# Altium schematic symbol library IC_ADI.SCHLIB: 3169 symbols (part 40 of 181) (continued)
## AD7147WPACPZ-1500R (continued)
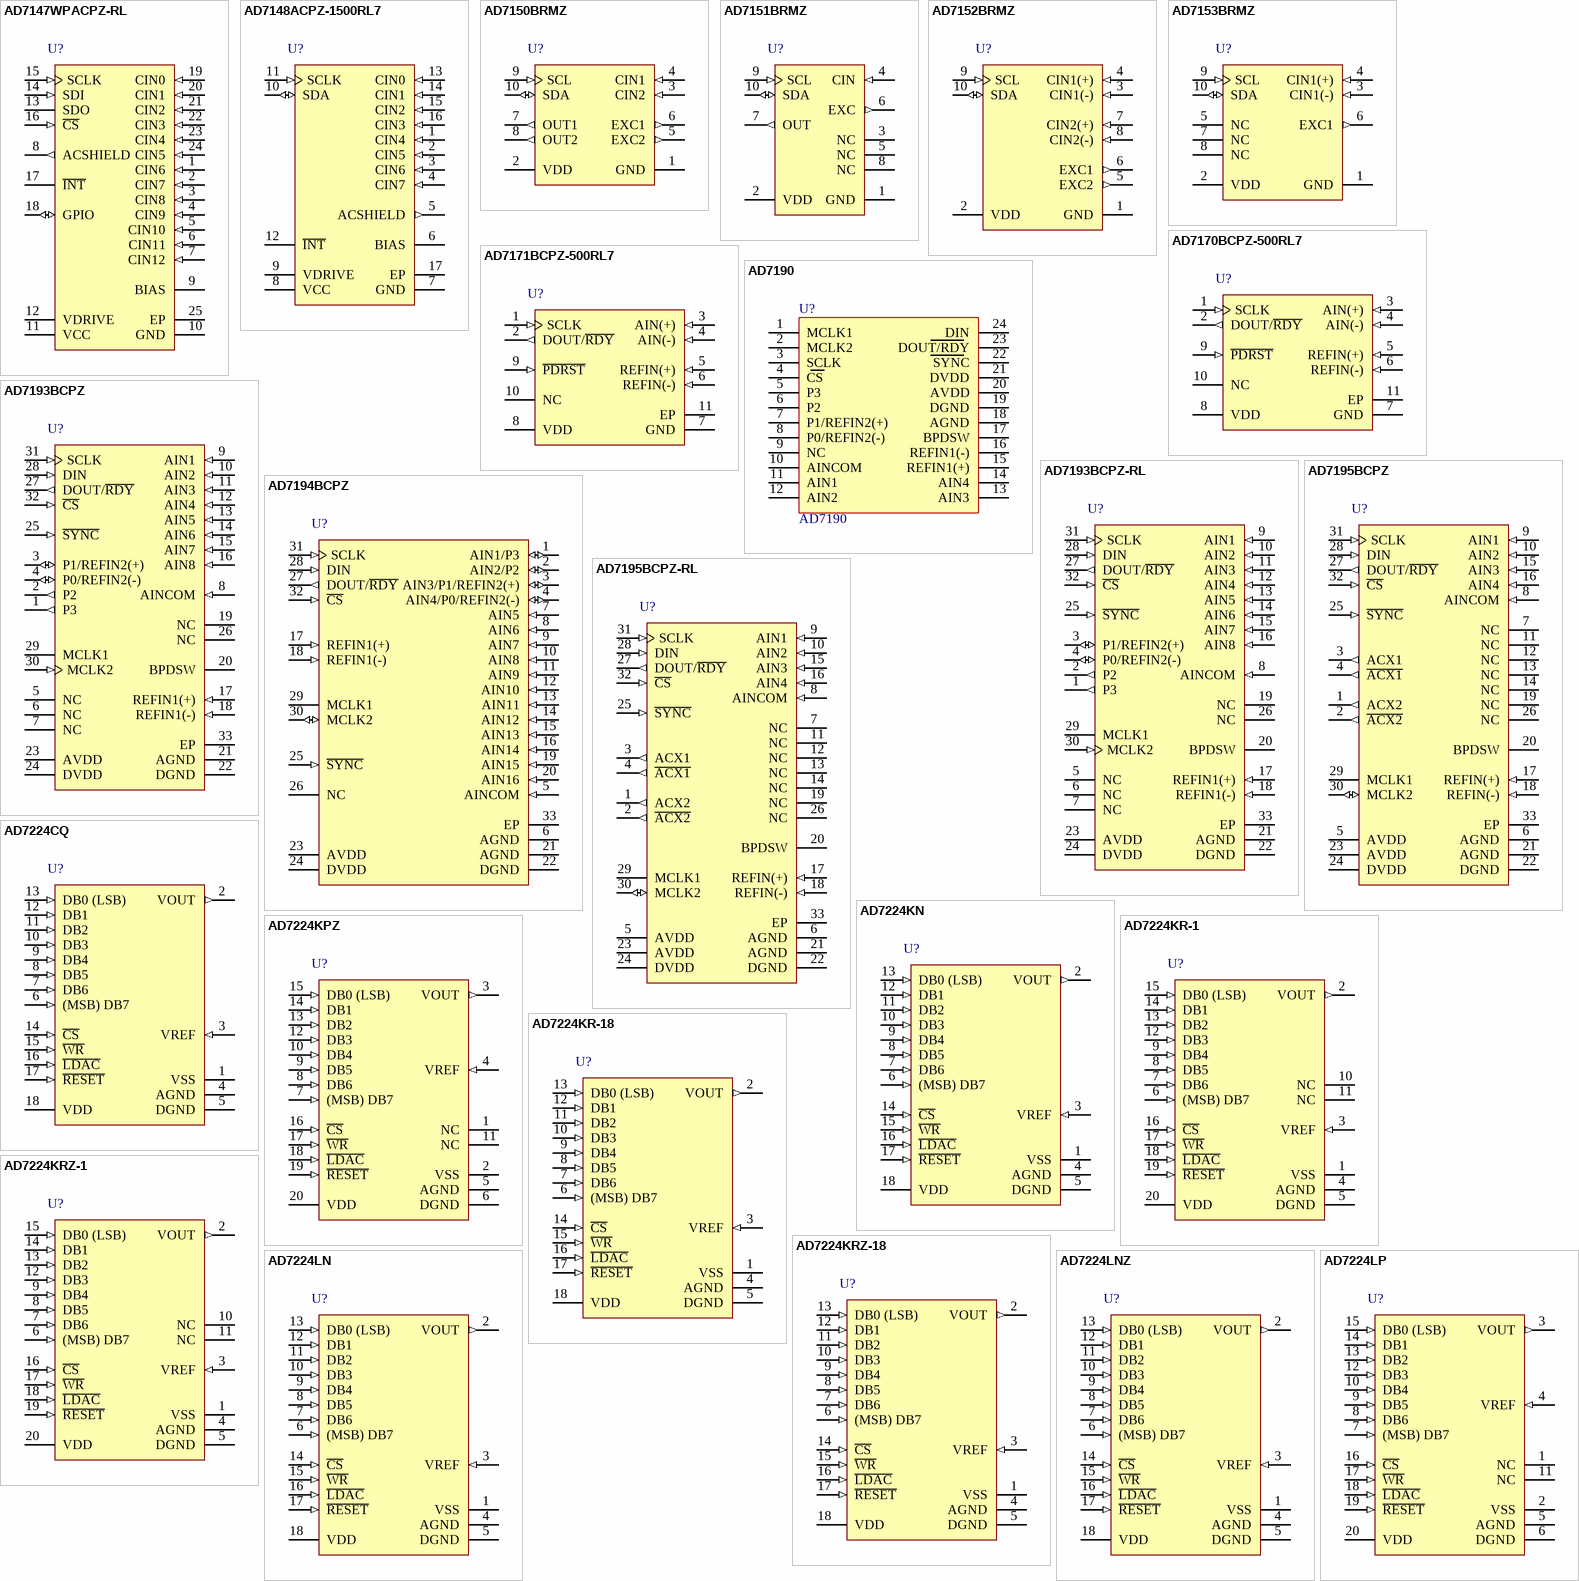
[diagram p36: symbols AD7147WPACPZ-RL to AD7224LP]

## AD7147WPACPZ-RL
designator U?
13 Channel CapTouch Programmable Controller for Single-Electrode Capacitance Sensors, 111SPS, -40 to +85 degC, CP-24-3, Pb-Free, Reel; Generic Part Number: AD7147; PartNumber: AD7147WPACPZ-RL; Resolution (Bits): 16; Channels: 13; Throughput Rate (SPS): 111; Interface: I2C/Ser 2-Wire, Ser, SPI; Automotive Qualified: Yes; DatasheetVersion: Rev.D; PackageVersion: Jan-2005; PackageReference: CP-24-3; PackageDescription: 24-Lead Lead Frame Chip Scale Package [LFCSP_VQ] 4 x 4 mm Body, Very Thin Quad; Supplier Part Number 1: AD7147WPACPZ-RL-ND; Supplier Part Number 2: 584-AD7147WPACPZ-R; RoHS: Y; Packing: Reel; Mounting Technology: Surface Mount; Code_JEDEC: MO-220-VGGD-8; ComponentLink1Description: Manufacturer URL; ComponentLink2Description: Datasheet; ComponentLink3Description: Package Specification; ComponentLink4Description: Product URL
footprint QFN24_0.5-PAD(4X4) (Footprint not found)
pins: 1 CIN6 (in) "Capacitance Sensor Input.", 2 CIN7 (in) "Capacitance Sensor Input.", 3 CIN8 (in) "Capacitance Sensor Input.", 4 CIN9 (in) "Capacitance Sensor Input.", 5 CIN10 (in) "Capacitance Sensor Input.", 6 CIN11 (in) "Capacitance Sensor Input.", 7 CIN12 (in) "Capacitance Sensor Input.", 8 ACSHIELD (out) "CDC Active Shield Output. Connect to external shield or plane.", 9 BIAS "Bias Node for Internal Circuitry. Requires 100 nF capacitor to ground.", 10 GND (power) "Ground Reference Point for All Circuitry.", 11 VCC (power) "Supply Voltage.", 12 VDRIVE (power) "Serial Interface Operating Voltage Supply.", 13 SDO (hiz) "SPI Serial Data Output.", 14 SDI (in) "SPI Serial Data Input.", 15 SCLK (in) "Clock Input for Serial Interface.", 16 ~{CS} (in) "SPI Chip Select Signal.", 17 ~{INT} (oc) "General-Purpose Open-Drain Interrupt Output. Programmable polarity; requires pull-up resistor.", 18 GPIO (io) "Programmable GPIO.", 19 CIN0 (in) "Capacitance Sensor Input.", 20 CIN1 (in) "Capacitance Sensor Input.", 21 CIN2 (in) "Capacitance Sensor Input.", 22 CIN3 (in) "Capacitance Sensor Input.", 23 CIN4 (in) "Capacitance Sensor Input.", 24 CIN5 (in) "Capacitance Sensor Input.", 25 EP (power) "Capacitance Sensor Input."

## AD7148ACPZ-1500RL7
designator U?
Octal 16-Bit Analog-to-Digital Converter with I2C/Ser 2-Wire, Serial Interface, 250kSPS, -40 to +85 degC, CP-16-13, Pb-Free, Reel; Generic Part Number: AD7148; PartNumber: AD7148ACPZ-1500RL7; Resolution (Bits): 16; Channels: 8; Throughput Rate (SPS): 4; DatasheetVersion: Rev.A; PackageVersion: 031006-A; PackageReference: CP-16-13; PackageDescription: 16-Lead Lead Frame Chip Scale Package [LFCSP_VQ] 4 x 4 mm Body, Very Thin Quad; Supplier Part Number 1: AD7148ACPZ-1500RL7TR-ND; Supplier Part Number 2: AD7148ACPZ-1500RL7CT-ND; Supplier Part Number 3: AD7148ACPZ-1500RL7DKR-ND; Supplier Part Number 4: 84M7803; Supplier Part Number 5: 584-AD7148ACPZ1500R7; Interface: I2C/Ser 2-Wire, Ser; RoHS: Y; Packing: Reel; Mounting Technology: Surface Mount; Code_JEDEC: MO-220-VGGC; ComponentLink1Description: Manufacturer URL; ComponentLink2Description: Datasheet; ComponentLink3Description: Package Specification; ComponentLink4Description: Product URL
footprint QFN16_0.65-PAD(4x4) (Footprint not found)
pins: 1 CIN4 (in) "Capacitance Sensor Input.", 2 CIN5 (in) "Capacitance Sensor Input.", 3 CIN6 (in) "Capacitance Sensor Input.", 4 CIN7 (in) "Capacitance Sensor Input.", 5 ACSHIELD (out) "CDC Active Shield Output. Connect to external shield.", 6 BIAS "Bias Node for Internal Circuitry. Requires 100 nF capacitor to ground.", 7 GND (power) "Ground Reference Point for All Circuitry.", 8 VCC (power) "Supply Voltage.", 9 VDRIVE (power) "Serial Interface Operating Voltage Supply.", 10 SDA (io) "I2C Serial Data Input/Output. SDA requires pull-up resistor.", 11 SCLK (in) "Clock Input for Serial Interface.", 12 ~{INT} (oc) "General-Purpose Open-Drain Interrupt Output. Programmable polarity; requires pull-up resistor.", 13 CIN0 (in) "Capacitance Sensor Input.", 14 CIN1 (in) "Capacitance Sensor Input.", 15 CIN2 (in) "Capacitance Sensor Input.", 16 CIN3 (in) "Capacitance Sensor Input.", 17 EP (power) "The exposed pad is not connected internally. For increased reliability of the solder joint and maximum thermal capability, it is recommended that the pad be soldered to the ground plane."

## AD7150BRMZ
designator U?
Dual 12-Bit Low Power Analog-to-Digital Converter with I2C/Ser 2-Wire, Serial Interface, 200SPS, -40 to +85 degC, RM-10, Pb-Free, Tube; Generic Part Number: AD7150; PartNumber: AD7150BRMZ; Resolution (Bits): 12; Channels: 2; Throughput Rate (SPS): 200; DatasheetVersion: Rev.0; PackageVersion: May-2005; PackageReference: RM-10; PackageDescription: 10-Lead Mini Small Outline Package [MSOP]; Supplier Part Number 1: AD7150BRMZ-ND; Supplier Part Number 2: 1563482; Supplier Part Number 3: 64M7550; Supplier Part Number 4: 584-AD7150BRMZ; Interface: I2C/Ser 2-Wire, Ser; RoHS: Y; Packing: Tube; Mounting Technology: Surface Mount; ComponentLink1Description: Manufacturer URL; ComponentLink2Description: Datasheet; ComponentLink3Description: Package Specification; ComponentLink4Description: Product URL
footprint VSSOP10_0.5 (Footprint not found)
pins: 1 GND (power) "Ground Pin.", 2 VDD (power) "Power Supply Voltage. This pin should be decoupled to GND using a low impedance capacitor, for example, 0.1uF X7R multilayer ceramic.", 3 CIN2 (in) "CDC Capacitive Input Channel 2. The measured capacitance (sensor) is connected between the EXC2 pin and the CIN2 pin. If not used, this pin can be left open circuit or connected to GND.", 4 CIN1 (in) "CDC Capacitive Input Channel 1. The measured capacitance (sensor) is connected between the EXC1 pin and the CIN1 pin. If not used, this pin can be left open circuit or connected to GND.", 5 EXC2 (out) "CDC Excitation Output Channel 2. The measured capacitance is connected between the EXC2 pin and the CIN2 pin. If not used, this pin should be left as an open circuit.", 6 EXC1 (out) "CDC Excitation Output Channel 1. The measured capacitance is connected between the EXC1 pin and the CIN1 pin. If not used, this pin should be left as an open circuit.", 7 OUT1 (out) "Logic Output Channel 1. A high level on this output indicates proximity detected on CIN1.", 8 OUT2 (out) "Logic Output Channel 2. A high level on this output indicates proximity detected on CIN2.", 9 SCL (in) "Serial Interface Clock Input. Connects to the master clock line. Requires a pull-up resistor if not provided elsewhere in the system.", 10 SDA (io) "Serial Interface Bidirectional Data. Connects to the master data line. Requires a pull-up resistor if not provided elsewhere in the system."

## AD7151BRMZ
designator U?
Single 12-Bit Low Power Analog-to-Digital Converter with I2C/Ser 2-Wire, Serial Interface, 100SPS, -40 to +85 degC, RM-10, Pb-Free, Tube; Generic Part Number: AD7151; PartNumber: AD7151BRMZ; Resolution (Bits): 12; Channels: 1; Throughput Rate (SPS): 100; DatasheetVersion: Rev.0; PackageVersion: May-2005; PackageReference: RM-10; PackageDescription: 10-Lead Mini Small Outline Package [MSOP]; Supplier Part Number 1: AD7151BRMZ-ND; Supplier Part Number 2: 64M7552; Supplier Part Number 3: 584-AD7151BRMZ; Interface: I2C/Ser 2-Wire, Ser; RoHS: Y; Packing: Tube; Mounting Technology: Surface Mount; ComponentLink1Description: Manufacturer URL; ComponentLink2Description: Datasheet; ComponentLink3Description: Package Specification; ComponentLink4Description: Product URL
footprint VSSOP10_0.5 (Footprint not found)
pins: 1 GND (power) "Ground Pin.", 2 VDD (power) "Power Supply Voltage. This pin should be decoupled to GND using a low impedance capacitor, for example, 0.1 uF X7R multilayer ceramic.", 3 NC "This pin should be left as an open circuit or connected to GND.", 4 CIN (in) "CDC Capacitive Input. The measured capacitance (sensor) is connected between the EXC pin and the CIN pin.", 5 NC "This pin should be left as an open circuit.", 6 EXC (out) "CDC Excitation Output. The measured capacitance is connected between the EXC pin and the CIN pin.", 7 OUT (out) "Logic Output. High level on this output indicates proximity detected on the capacitive input.", 8 NC "This pin should be left as an open circuit.", 9 SCL (in) "Serial Interface Clock Input. Connects to the master clock line. Requires a pull-up resistor if not provided elsewhere in the system.", 10 SDA (io) "Serial Interface Bidirectional Data. Connects to the master data line. Requires a pull-up resistor if not provided elsewhere in the system."

## AD7152BRMZ
designator U?
Dual 12-Bit Capacitance-to-Digital Converter with I2C/Ser 2-Wire, Serial Interface, 200SPS, -40 to +85 degC, RM-10, Pb-Free, Tube; Generic Part Number: AD7152; PartNumber: AD7152BRMZ; Resolution (Bits): 12; Channels: 2; Throughput Rate (SPS): 200; DatasheetVersion: Rev.0; PackageVersion: May-2005; PackageReference: RM-10; PackageDescription: 10-Lead Mini Small Outline Package [MSOP]; Supplier Part Number 1: AD7152BRMZ-ND; Supplier Part Number 2: 584-AD7152BRMZ; Interface: I2C/Ser 2-Wire, Ser; RoHS: Y; Packing: Tube; Mounting Technology: Surface Mount; ComponentLink1Description: Manufacturer URL; ComponentLink2Description: Datasheet; ComponentLink3Description: Package Specification; ComponentLink4Description: Product URL
footprint VSSOP10_0.5 (Footprint not found)
pins: 1 GND (power) "Ground Pin.", 2 VDD (power) "Power Supply Voltage. This pin should be decoupled to GND, using a low impedance capacitor, for example, in combination with a 10 uF tantalum and a 0.1 uF multilayer ceramic capacitor.", 3 CIN1(-) (in) "CDC Negative Capacitive Input of Channel 1. If not used, this pin can be left as an open circuit or connected to GND. This pin is internally disconnected in single-ended CDC configuration.", 4 CIN1(+) (in) "CDC Positive Capacitive Input of Channel 1. If not used, this pin can be left as an open circuit or connected to GND.", 5 EXC2 (out) "CDC Excitation Output for Channel 2. The measured capacitance is connected between one of the EXC pins and one of the CIN pins. If not used, these pins should be left as an open circuit.", 6 EXC1 (out) "CDC Excitation Output for Channel 1. The measured capacitance is connected between one of the EXC pins and one of the CIN pins. If not used, these pins should be left as an open circuit.", 7 CIN2(+) (in) "CDC Positive Capacitive Input of Channel 2. If not used, this pin can be left as an open circuit or connected to GND.", 8 CIN2(-) (in) "CDC Negative Capacitive Input of Channel 2. If not used, this pin can be left as an open circuit or connected to GND. This pin is internally disconnected in single-ended CDC configuration.", 9 SCL (in) "Serial Interface Clock Input. Connects to the master clock line. Requires a pull-up resistor if one is not already provided in the system.", 10 SDA (io) "Serial Interface Bidirectional Data. Connects to the master data line. Requires a pull-up resistor if one is not provided elsewhere in the system."

## AD7153BRMZ
designator U?
Single 12-Bit Capacitance-to-Digital Converter with I2C/Ser 2-Wire, Serial Interface, 200SPS, -40 to +85 degC, RM-10, Pb-Free, Tube; Generic Part Number: AD7153; PartNumber: AD7153BRMZ; Resolution (Bits): 12; Channels: 1; Throughput Rate (SPS): 200; DatasheetVersion: Rev.0; PackageVersion: May-2005; PackageReference: RM-10; PackageDescription: 10-Lead Mini Small Outline Package [MSOP]; Supplier Part Number 1: AD7153BRMZ-ND; Supplier Part Number 2: 11N8856; Supplier Part Number 3: 584-AD7153BRMZ; Interface: I2C/Ser 2-Wire, Ser; RoHS: Y; Packing: Tube; Mounting Technology: Surface Mount; ComponentLink1Description: Manufacturer URL; ComponentLink2Description: Datasheet; ComponentLink3Description: Package Specification; ComponentLink4Description: Product URL
footprint VSSOP10_0.5 (Footprint not found)
pins: 1 GND (power) "Ground Pin.", 2 VDD (power) "Power Supply Voltage. This pin should be decoupled to GND, using a low impedance capacitor, for example, in combination with a 10 uF tantalum and a 0.1 uF multilayer ceramic capacitor.", 3 CIN1(-) (in) "CDC Negative Capacitive Input of Channel 1. If not used, this pin can be left as an open circuit or connected to GND. This pin is internally disconnected in single-ended CDC configuration.", 4 CIN1(+) (in) "CDC Positive Capacitive Input of Channel 1. If not used, this pin can be left as an open circuit or connected to GND.", 5 NC "No Connect. This pin must be left as an open circuit.", 6 EXC1 (out) "CDC Excitation Output for Channel 1. The measured capacitance is connected between one of the EXC pins and one of the CIN pins. If not used, these pins should be left as an open circuit.", 7 NC "No Connect. This pin must be left as an open circuit.", 8 NC "No Connect. This pin must be left as an open circuit.", 9 SCL (in) "Serial Interface Clock Input. Connects to the master clock line. Requires a pull-up resistor if one is not already provided in the system.", 10 SDA (io) "Serial Interface Bidirectional Data. Connects to the master data line. Requires a pull-up resistor if one is not provided elsewhere in the system."

## AD7170BCPZ-500RL7
designator U?
Single 12-Bit Low Power Sigma-Delta Analog-to-Digital Converter with Serial, SPI Interface, 125SPS, -40 to +105 degC, CP-10-3, Pb-Free, Reel; Generic Part Number: AD7170; PartNumber: AD7170BCPZ-500RL7; Resolution (Bits): 12; Channels: 1; Throughput Rate (SPS): 125; Interface: Ser, SPI; DatasheetVersion: Rev.A; PackageVersion: 2005; PackageReference: CP-10-3; PackageDescription: 10-Lead Lead Frame Chip Scale Package [LFCSP_WD] 3 x 3 mm Body, Very Very Thin, Dual Lead; Supplier Part Number 1: 1827292; Supplier Part Number 2: 81R1736; Supplier Part Number 3: 584-AD7170BCPZ-500R7; RoHS: Y; Packing: Reel; Mounting Technology: Surface Mount; ComponentLink1Description: Manufacturer URL; ComponentLink2Description: Datasheet; ComponentLink3Description: Package Specification; ComponentLink4Description: Product URL
footprint DFN10_0.5-PAD(3X3) (Footprint not found)
pins: 1 SCLK (in) "Serial Clock Input. This serial clock input is for data transfers from the ADC. The SCLK has a Schmitt-triggered input. The serial clock can be continuous with all data transmitted in a constant train of pulses. (See Datasheet)", 2 DOUT/~{RDY} (out) "Serial Data Output/Data Ready Output. DOUT/R\D\Y\ serves a dual purpose. DOUT/R\D\Y\ operates as a data ready pin, going low to indicate the completion of a conversion. In addition, it functions as a serial data output pin (See Datasheet)", 3 AIN(+) (in) "Analog Input. AIN(+) is the positive terminal of the differential analog input pair AIN(+)/AIN(-).", 4 AIN(-) (in) "Analog Input. AIN(-) is the negative terminal of the differential analog input pair AIN(+)/AIN(-).", 5 REFIN(+) (in) "Positive Reference Input. An external reference can be applied between REFIN(+) and REFIN(-). The nominal reference voltage (REFIN(+) - REFIN(?)) is 5 V, but the part can function with a reference of 0.5 V to VDD.", 6 REFIN(-) (in) "Negative Reference Input.", 7 GND (power) "Ground Reference Point.", 8 VDD (power) "Supply Voltage, 2.7 V to 5.25 V.", 9 ~{PDRST} (in) "Power-Down/Reset. When this pin is low, the ADC is placed in power-down mode. All the logic on the chip is reset, and the DOUT/R\D\Y\ pin is tristated. When P\D\R\S\T\ is high, the ADC is taken out of power-down mode. The (See Datasheet)", 10 NC "This pin should be connected to GND for correct operation.", 11 EP (power) "Connect the exposed pad to ground."

## AD7171BCPZ-500RL7
designator U?
Single 16-Bit Low Power Sigma-Delta Analog-to-Digital Converter with Serial, SPI Interface, 125SPS, -40 to +105 degC, CP-10-3, Pb-Free, Reel; Generic Part Number: AD7171; PartNumber: AD7171BCPZ-500RL7; Resolution (Bits): 16; Channels: 1; Throughput Rate (SPS): 125; Interface: Ser, SPI; DatasheetVersion: Rev.0; PackageVersion: 2005; PackageReference: CP-10-3; PackageDescription: 10-Lead Lead Frame Chip Scale Package [LFCSP_WD] 3 x 3 mm Body, Very Very Thin, Dual Lead; Supplier Part Number 1: AD7171BCPZ-500RL7TR-ND; Supplier Part Number 2: AD7171BCPZ-500RL7CT-ND; Supplier Part Number 3: AD7171BCPZ-500RL7DKR-ND; Supplier Part Number 4: 1827293; Supplier Part Number 5: 52R8151; Supplier Part Number 6: 24W8482; Supplier Part Number 7: 584-AD7171BCPZ-500R7; RoHS: Y; Packing: Reel; Mounting Technology: Surface Mount; ComponentLink1Description: Manufacturer URL; ComponentLink2Description: Datasheet; ComponentLink3Description: Package Specification; ComponentLink4Description: Product URL
footprint DFN10_0.5-PAD(3X3) (Footprint not found)
pins: 1 SCLK (in) "Serial Clock Input. This serial clock input is for data transfers from the ADC. The SCLK has a Schmitt-triggered input. The serial clock can be continuous with all data transmitted in a constant train of pulses. (See Datasheet)", 2 DOUT/~{RDY} (out) "Serial Data Output/Data Ready Output. DOUT/R\D\Y\ serves a dual purpose. DOUT/R\D\Y\ operates as a data ready pin, going low to indicate the completion of a conversion. In addition, it functions as a serial data output pin (See Datasheet)", 3 AIN(+) (in) "Analog Input. AIN(+) is the positive terminal of the differential analog input pair AIN(+)/AIN(-).", 4 AIN(-) (in) "Analog Input. AIN(-) is the negative terminal of the differential analog input pair AIN(+)/(AIN-).", 5 REFIN(+) (in) "Positive Reference Input. An external reference can be applied between REFIN(+) and REFIN(-). The nominal reference voltage (REFIN(+)- REFIN(-)) is 5 V, but the part can function with a reference of 0.5 V to VDD.", 6 REFIN(-) (in) "Negative Reference Input.", 7 GND (power) "Ground Reference Point.", 8 VDD (power) "Supply Voltage, 2.7 V to 5.25 V.", 9 ~{PDRST} (in) "Power-Down/Reset. When this pin is low, the ADC is placed in power-down mode. All the logic on the chip is reset and the DOUT/R\D\Y\ pin is tristated. When P\D\R\S\T\ is high, the ADC is taken out of power-down mode. The (See Datasheet)", 10 NC "This pin should be connected to GND for correct operation.", 11 EP (power) "Connect the exposed pad to ground."

## AD7190
designator U?
footprint TSSOP24_0.65 (TSOP, 24-Leads, Body 7.80x4.40mm, Pitch 0.65mm, Thermal Pad 5.16x2.40mm, IPC Low Density)
pins: 1 MCLK1, 2 MCLK2, 3 SCLK, 4 CS, 5 P3, 6 P2, 7 P1/REFIN2(+), 8 P0/REFIN2(-), 9 NC, 10 AINCOM, 11 AIN1, 12 AIN2, 13 AIN3, 14 AIN4, 15 REFIN1(+), 16 REFIN1(-), 17 BPDSW, 18 AGND, 19 DGND, 20 AVDD, 21 DVDD, 22 SYNC, 23 DOUT/RDY, 24 DIN

## AD7193BCPZ
designator U?
Quad 24-Bit Ultralow Noise Sigma-Delta Analog-to-Digital Converter with Serial, SPI Interface and PGA, 4.8KSPS, -40 to +105 degC, CP-32-11, Pb-Free, Tray; Generic Part Number: AD7193; PartNumber: AD7193BCPZ; Resolution (Bits): 24; Channels: 4; Throughput Rate (SPS): 4.8K; Interface: Ser, SPI; DatasheetVersion: Rev.C; PackageVersion: 011708-A; PackageReference: CP-32-11; PackageDescription: 32-Lead Lead Frame Chip Scale Package [LFCSP_VQ] 5 x 5 mm Body, Very Thin Quad; Supplier Part Number 1: AD7193BCPZ-ND; Supplier Part Number 2: 74R5970; Supplier Part Number 3: 584-AD7193BCPZ; RoHS: Y; Packing: Tray; Mounting Technology: Surface Mount; ComponentLink1Description: Manufacturer URL; ComponentLink2Description: Datasheet; ComponentLink3Description: Package Specification; ComponentLink4Description: Product URL
footprint QFN32_0.5-PAD(5X5) (Footprint not found)
pins: 1 P3 (out) "Digital Output Pin. This pin can function as a general-purpose output bit referenced between AVDD and AGND.", 2 P2 (out) "Digital Output Pin. This pin can function as a general-purpose output bit referenced between AVDD and AGND.", 3 P1/REFIN2(+) (io) "Digital Output Pin/Positive Reference Input. This pin functions as a general-purpose output bit referenced between AVDD and AGND. When the REFSEL bit in the configuration register = 1, this pin functions as REFIN2(+). An (See Datasheet)", 4 P0/REFIN2(-) (io) "Digital Output Pin/Negative Reference Input. This pin functions as a general-purpose output bit referenced between AVDD and AGND. When the REFSEL bit in the configuration register = 1, this pin functions as REFIN2(-). This (See Datasheet)", 5 NC "No Connect. Tie these pins to AGND.", 6 NC "No Connect. Tie these pins to AGND.", 7 NC "No Connect. Tie these pins to AGND.", 8 AINCOM (in) "Analog Input AIN1 to Analog Input AIN8 are referenced to this input when configured for pseudo differential operation.", 9 AIN1 (in) "Analog Input. This pin can be configured as the positive input of a fully differential input pair when used with AIN2 or as a pseudo differential input when used with AINCOM.", 10 AIN2 (in) "Analog Input. This pin can be configured as the negative input of a fully differential input pair when used with AIN1 or as a pseudo differential input when used with AINCOM.", 11 AIN3 (in) "Analog Input. This pin can be configured as the positive input of a fully differential input pair when used with AIN4 or as a pseudo differential input when used with AINCOM.", 12 AIN4 (in) "Analog Input. This pin can be configured as the negative input of a fully differential input pair when used with AIN3 or as a pseudo differential input when used with AINCOM.", 13 AIN5 (in) "Analog Input. This pin can be configured as the positive input of a fully differential input pair when used with AIN6 or as a pseudo differential input when used with AINCOM.", 14 AIN6 (in) "Analog Input. This pin can be configured as the negative input of a fully differential input pair when used with AIN5 or as a pseudo differential input when used with AINCOM.", 15 AIN7 (in) "Analog Input. This pin can be configured as the positive input of a fully differential input pair when used with AIN8 or as a pseudo differential input when used with AINCOM.", 16 AIN8 (in) "Analog Input. This pin can be configured as the negative input of a fully differential input pair when used with AIN7 or as a pseudo differential input when used with AINCOM.", 17 REFIN1(+) (in) "Positive Reference Input. An external reference can be applied between REFIN1(+) and REFIN1(-). REFIN1(+) can lie anywhere between AVDD and AGND + 1 V. The nominal reference voltage, (REFIN1(+) - REFIN1(-)), is AVDD, but the (See Datasheet)", 18 REFIN1(-) (in) "Negative Reference Input. This reference input can lie anywhere between AGND and AVDD - 1 V.", 19 NC "No Connect. Tie these pins to AGND.", 20 BPDSW "Bridge Power-Down Switch to AGND.", 21 AGND (power) "Analog Ground Reference Point.", 22 DGND (power) "Digital Ground Reference Point.", 23 AVDD (power) "Analog Supply Voltage, 3 V to 5.25 V. AVDD is independent of DVDD. Therefore, DVDD can be operated at 3 V with AVDD at 5 V or vice versa.", 24 DVDD (power) "Digital Supply Voltage, 2.7 V to 5.25 V. DVDD is independent of AVDD. Therefore, AVDD can be operated at 3 V with DVDD at 5 V or vice versa.", 25 ~{SYNC} (in) "Logic input that allows for S\Y\N\C\hronization of the digital filters and analog modulators when using a number of AD7193 devices. While S\Y\N\C\ is low, the nodes of the digital filter, the filter control logic, and the (See Datasheet)", 26 NC "No Connect. Tie these pins to AGND.", 27 DOUT/~{RDY} (out) "Serial Data Output/Data Ready Output. DOUT/R\D\Y\ serves a dual purpose. It functions as a serial data output pin to access the output shift register of the ADC. The output shift register can contain data from any of the (See Datasheet)", 28 DIN (in) "Serial Data Input to the Input Shift Register on the ADC. Data in this shift register is transferred to the control registers in the ADC, with the register selection bits of the communications register identifying the (See Datasheet)", 29 MCLK1 "When the master clock for the device is provided externally by a crystal, the crystal is connected between MCLK1 and MCLK2.", 30 MCLK2 (in) "Master Clock Signal for the Device. The AD7193 has an internal 4.92 MHz clock. This internal clock can be made available on the MCLK2 pin. The clock for the AD7193 can also be provided externally in the form of a crystal or (See Datasheet)", 31 SCLK (in) "Serial Clock Input. This serial clock input is for data transfers to and from the ADC. The SCLK has a Schmitt-triggered input, making the interface suitable for opto-isolated applications. The serial clock can be continuous (See Datasheet)", 32 ~{CS} (in) "Chip Select Input. This is an active low logic input used to select the ADC. C\S\ can be used to select the ADC in systems with more than one device on the serial bus or as a frame S\Y\N\C\hronization signal in communicating (See Datasheet)", 33 EP (power) "The exposed pad must be connected to AGND."

## AD7193BCPZ-RL
designator U?
Quad 24-Bit Ultralow Noise Sigma-Delta Analog-to-Digital Converter with Serial, SPI Interface and PGA, 4.8KSPS, -40 to +105 degC, CP-32-11, Pb-Free, Reel; Generic Part Number: AD7193; PartNumber: AD7193BCPZ-RL; Resolution (Bits): 24; Channels: 4; Throughput Rate (SPS): 4.8K; Interface: Ser, SPI; DatasheetVersion: Rev.C; PackageVersion: 011708-A; PackageReference: CP-32-11; PackageDescription: 32-Lead Lead Frame Chip Scale Package [LFCSP_VQ] 5 x 5 mm Body, Very Thin Quad; Supplier Part Number 1: AD7193BCPZ-RL-ND; Supplier Part Number 2: 584-AD7193BCPZ-R; RoHS: Y; Packing: Reel; Mounting Technology: Surface Mount; ComponentLink1Description: Manufacturer URL; ComponentLink2Description: Datasheet; ComponentLink3Description: Package Specification; ComponentLink4Description: Product URL
footprint QFN32_0.5-PAD(5X5) (Footprint not found)
pins: 1 P3 (out) "Digital Output Pin. This pin can function as a general-purpose output bit referenced between AVDD and AGND.", 2 P2 (out) "Digital Output Pin. This pin can function as a general-purpose output bit referenced between AVDD and AGND.", 3 P1/REFIN2(+) (io) "Digital Output Pin/Positive Reference Input. This pin functions as a general-purpose output bit referenced between AVDD and AGND. When the REFSEL bit in the configuration register = 1, this pin functions as REFIN2(+). An (See Datasheet)", 4 P0/REFIN2(-) (io) "Digital Output Pin/Negative Reference Input. This pin functions as a general-purpose output bit referenced between AVDD and AGND. When the REFSEL bit in the configuration register = 1, this pin functions as REFIN2(-). This (See Datasheet)", 5 NC "No Connect. Tie these pins to AGND.", 6 NC "No Connect. Tie these pins to AGND.", 7 NC "No Connect. Tie these pins to AGND.", 8 AINCOM (in) "Analog Input AIN1 to Analog Input AIN8 are referenced to this input when configured for pseudo differential operation.", 9 AIN1 (in) "Analog Input. This pin can be configured as the positive input of a fully differential input pair when used with AIN2 or as a pseudo differential input when used with AINCOM.", 10 AIN2 (in) "Analog Input. This pin can be configured as the negative input of a fully differential input pair when used with AIN1 or as a pseudo differential input when used with AINCOM.", 11 AIN3 (in) "Analog Input. This pin can be configured as the positive input of a fully differential input pair when used with AIN4 or as a pseudo differential input when used with AINCOM.", 12 AIN4 (in) "Analog Input. This pin can be configured as the negative input of a fully differential input pair when used with AIN3 or as a pseudo differential input when used with AINCOM.", 13 AIN5 (in) "Analog Input. This pin can be configured as the positive input of a fully differential input pair when used with AIN6 or as a pseudo differential input when used with AINCOM.", 14 AIN6 (in) "Analog Input. This pin can be configured as the negative input of a fully differential input pair when used with AIN5 or as a pseudo differential input when used with AINCOM.", 15 AIN7 (in) "Analog Input. This pin can be configured as the positive input of a fully differential input pair when used with AIN8 or as a pseudo differential input when used with AINCOM.", 16 AIN8 (in) "Analog Input. This pin can be configured as the negative input of a fully differential input pair when used with AIN7 or as a pseudo differential input when used with AINCOM.", 17 REFIN1(+) (in) "Positive Reference Input. An external reference can be applied between REFIN1(+) and REFIN1(-). REFIN1(+) can lie anywhere between AVDD and AGND + 1 V. The nominal reference voltage, (REFIN1(+) - REFIN1(-)), is AVDD, but the (See Datasheet)", 18 REFIN1(-) (in) "Negative Reference Input. This reference input can lie anywhere between AGND and AVDD - 1 V.", 19 NC "No Connect. Tie these pins to AGND.", 20 BPDSW "Bridge Power-Down Switch to AGND.", 21 AGND (power) "Analog Ground Reference Point.", 22 DGND (power) "Digital Ground Reference Point.", 23 AVDD (power) "Analog Supply Voltage, 3 V to 5.25 V. AVDD is independent of DVDD. Therefore, DVDD can be operated at 3 V with AVDD at 5 V or vice versa.", 24 DVDD (power) "Digital Supply Voltage, 2.7 V to 5.25 V. DVDD is independent of AVDD. Therefore, AVDD can be operated at 3 V with DVDD at 5 V or vice versa.", 25 ~{SYNC} (in) "Logic input that allows for S\Y\N\C\hronization of the digital filters and analog modulators when using a number of AD7193 devices. While S\Y\N\C\ is low, the nodes of the digital filter, the filter control logic, and the (See Datasheet)", 26 NC "No Connect. Tie these pins to AGND.", 27 DOUT/~{RDY} (out) "Serial Data Output/Data Ready Output. DOUT/R\D\Y\ serves a dual purpose. It functions as a serial data output pin to access the output shift register of the ADC. The output shift register can contain data from any of the (See Datasheet)", 28 DIN (in) "Serial Data Input to the Input Shift Register on the ADC. Data in this shift register is transferred to the control registers in the ADC, with the register selection bits of the communications register identifying the (See Datasheet)", 29 MCLK1 "When the master clock for the device is provided externally by a crystal, the crystal is connected between MCLK1 and MCLK2.", 30 MCLK2 (in) "Master Clock Signal for the Device. The AD7193 has an internal 4.92 MHz clock. This internal clock can be made available on the MCLK2 pin. The clock for the AD7193 can also be provided externally in the form of a crystal or (See Datasheet)", 31 SCLK (in) "Serial Clock Input. This serial clock input is for data transfers to and from the ADC. The SCLK has a Schmitt-triggered input, making the interface suitable for opto-isolated applications. The serial clock can be continuous (See Datasheet)", 32 ~{CS} (in) "Chip Select Input. This is an active low logic input used to select the ADC. C\S\ can be used to select the ADC in systems with more than one device on the serial bus or as a frame S\Y\N\C\hronization signal in communicating (See Datasheet)", 33 EP (power) "The exposed pad must be connected to AGND."

## AD7194BCPZ
designator U?
Octal 24-Bit Ultralow Noise Sigma-Delta Analog-to-Digital Converter with Serial, SPI Interface and PGA, 4.8KSPS, -40 to +105 degC, CP-32-11, Pb-Free, Tray; Generic Part Number: AD7194; PartNumber: AD7194BCPZ; Resolution (Bits): 24; Channels: 8; Throughput Rate (SPS): 4.8K; Interface: Ser, SPI; DatasheetVersion: Rev.0; PackageVersion: 011708-A; PackageReference: CP-32-11; PackageDescription: 32-Lead Lead Frame Chip Scale Package [LFCSP_VQ] 5 x 5 mm Body, Very Thin Quad; Supplier Part Number 1: AD7194BCPZ-ND; Supplier Part Number 2: 1827288; Supplier Part Number 3: 58R3898; Supplier Part Number 4: 584-AD7194BCPZ; RoHS: Y; Packing: Tray; Mounting Technology: Surface Mount; ComponentLink1Description: Manufacturer URL; ComponentLink2Description: Datasheet; ComponentLink3Description: Package Specification; ComponentLink4Description: Product URL
footprint QFN32_0.5-PAD(5X5) (Footprint not found)
pins: 1 AIN1/P3 (io) "Analog Input/Digital Output Pin. This pin can function as an analog input pin. When the GP32EN bit is set to 1, the pin functions as a general-purpose output bit referenced between AVDD and AGND.", 2 AIN2/P2 (io) "Analog Input/Digital Output Pin. This pin can function as an analog input pin. When the GP32EN bit is set to 1, the pin functions as a general-purpose output bit referenced between AVDD and AGND.", 3 AIN3/P1/REFIN2(+) (io) "Analog Input/Digital Output Pin/Positive Reference Input. This pin functions as an analog input pin. When the GP10EN bit is set to 1, the pin functions as a general-purpose output bit referenced between AVDD and AGND. When (See Datasheet)", 4 AIN4/P0/REFIN2(-) (io) "Analog Input/Digital Output Pin/Positive Reference Input. This pin functions as an analog input pin. When the GP10EN bit is set to 1, the pin functions as a general-purpose output bit referenced between AVDD and AGND. When (See Datasheet)", 5 AINCOM (in) "Analog Input AIN1 to Analog Input AIN16 are referenced to this input when the bit pseudo is set to 1.", 6 AGND (power) "Analog Ground Reference Point.", 7 AIN5 (in) "Analog Input Pin.", 8 AIN6 (in) "Analog Input Pin.", 9 AIN7 (in) "Analog Input Pin.", 10 AIN8 (in) "Analog Input Pin.", 11 AIN9 (in) "Analog Input Pin.", 12 AIN10 (in) "Analog Input Pin.", 13 AIN11 (in) "Analog Input Pin.", 14 AIN12 (in) "Analog Input Pin.", 15 AIN13 (in) "Analog Input Pin.", 16 AIN14 (in) "Analog Input Pin.", 17 REFIN1(+) (in) "Positive Reference Input. An external reference can be applied between REFIN1(+) and REFIN1(-). REFIN1(+) can lie anywhere between AVDD and AGND + 1 V. The nominal reference voltage, (REFIN1(+) - REFIN1(-)), is AVDD, but the (See Datasheet)", 18 REFIN1(-) (in) "Negative Reference Input. This reference input can lie anywhere between AGND and AVDD - 1 V.", 19 AIN15 (in) "Analog Input Pin.", 20 AIN16 (in) "Analog Input Pin.", 21 AGND (power) "Analog Ground Reference Point.", 22 DGND (power) "Digital Ground Reference Point.", 23 AVDD (power) "Analog Supply Voltage, 3 V to 5.25 V. AVDD is independent of DVDD. Therefore, DVDD can be operated at 3 V with AVDD at 5 V or vice versa.", 24 DVDD (power) "Digital Supply Voltage, 2.7 V to 5.25 V. DVDD is independent of AVDD. Therefore, AVDD can be operated at 3 V with DVDD at 5 V or vice versa.", 25 ~{SYNC} (in) "Logic input that allows for synchronization of the digital filters and analog modulators when using a number of AD7194 devices. While S\Y\N\C\ is low, the nodes of the digital filter, the filter control logic, and the (See Datasheet)", 26 NC (power) "This pin should be connected to GND for correct operation.", 27 DOUT/~{RDY} (out) "Serial Data Output/Data Ready Output. DOUT/R\D\Y\ serves a dual purpose. It functions as a serial data output pin to access the output shift register of the ADC. The output shift register can contain data from any of the (See Datasheet)", 28 DIN (in) "Serial Data Input to the Input Shift Register on the ADC. Data in this shift register is transferred to the control registers in the ADC, with the register selection bits of the communications register identifying the (See Datasheet)", 29 MCLK1 "When the master clock for the device is provided externally by a crystal, the crystal is connected between MCLK1 and MCLK2.", 30 MCLK2 (io) "Master Clock Signal for the Device. The AD7194 has an internal 4.92 MHz clock. This internal clock can be made available on the MCLK2 pin. The clock for the AD7194 can also be provided externally in the form of a crystal or (See Datasheet)", 31 SCLK (in) "Serial Clock Input. This serial clock input is for data transfers to and from the ADC. The SCLK has a Schmitt-triggered input, making the interface suitable for opto-isolated applications. The serial clock can be continuous (See Datasheet)", 32 ~{CS} (in) "Chip Select Input. This is an active low logic input used to select the ADC. C\S\ can be used to select the ADC in systems with more than one device on the serial bus or as a frame synchronization signal in communicating (See Datasheet)", 33 EP (power) "Connect exposed pad to AGND."